# Altium footprint library phoenix.PcbLib: 55 footprints (part 1 of 4)
Each footprint in its own frame and in the unit in brackets; x right, y up, seen from the top. Pads: shape width x height; smd on the part's side, far side on the other; paste and mask are expansions set on the pad; w line width, h text height; cw(c..) or ccw(c..) is an arc to the next point about the centre after c.
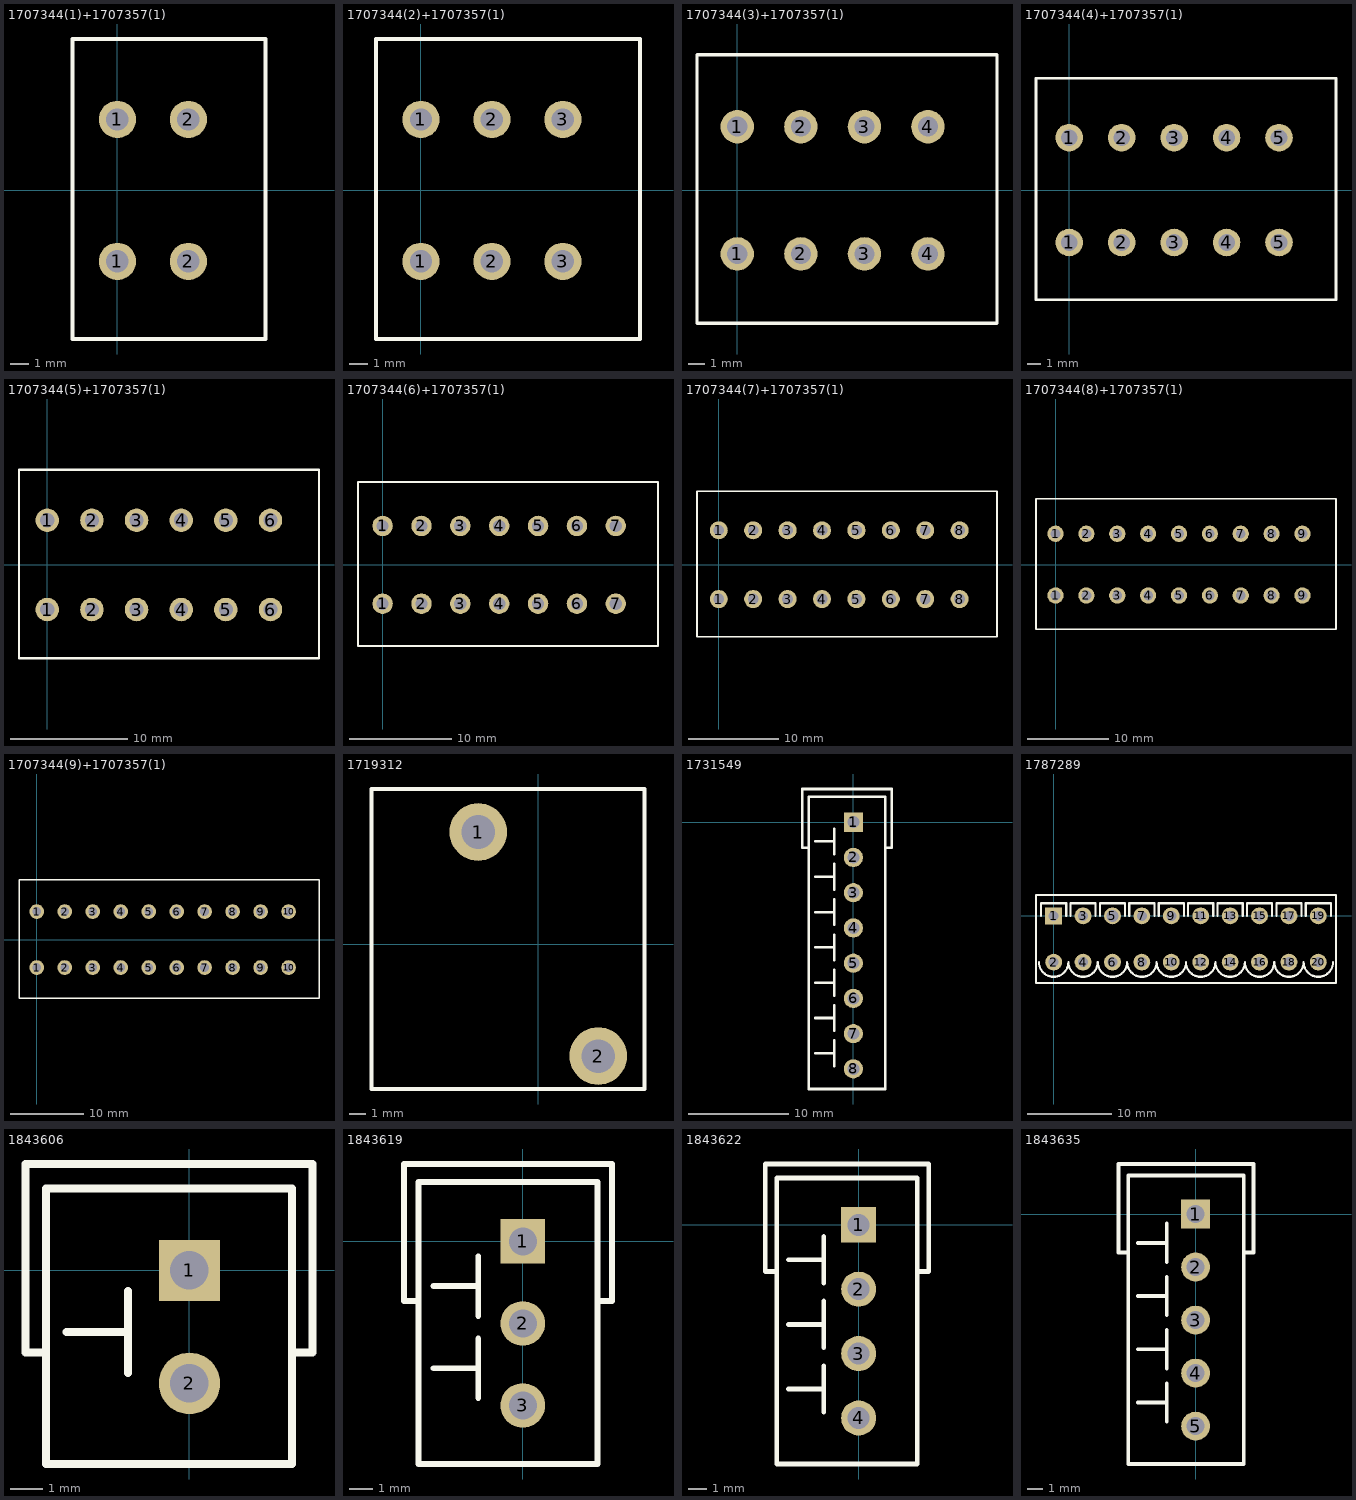
[diagram p0: the footprints below, top view; thin cyan lines are the x and y axes]

## 1707344(1)+1707357(1) [mm] "2 position 3.81mm spring terminals, vertical"
pads (4):
  round 2 hole 1.2: 1(0,-3.81) 1(0,3.81) 2(3.81,-3.81) 2(3.81,3.81)
Top Overlay:
  lines w0.203: -2.413,-7.976 -2.413,8.128 7.95,8.128 7.95,-7.976 -2.413,-7.976
3D body "1707344_01.stp": height 15.56, standoff -3.49, extent -2.311,-7.874 3.299,8.026
3D body "1707357_02.stp": height 15.56, standoff -3.49, extent 1.499,-7.874 7.849,8.026

## 1707344(2)+1707357(1) [mm] "3 position 3.81mm spring terminals, vertical"
pads (6):
  round 2 hole 1.2: 1(0,-3.81) 1(0,3.81) 2(3.81,-3.81) 2(3.81,3.81) 3(7.62,-3.81) 3(7.62,3.81)
Top Overlay:
  lines w0.203: -2.413,-7.976 -2.413,8.128 11.76,8.128 11.76,-7.976 -2.413,-7.976
3D body "1707344_01.stp": height 15.56, standoff -3.49, extent -2.311,-7.874 3.299,8.026
3D body "1707357_02.stp": height 15.56, standoff -3.49, extent 5.309,-7.874 11.659,8.026
3D body "1707344_01.stp": height 15.56, standoff -3.49, extent 1.499,-7.874 7.109,8.026

## 1707344(3)+1707357(1) [mm] "4 position 3.81mm spring terminals, vertical"
pads (8):
  round 2 hole 1.2: 1(0,-3.81) 1(0,3.81) 2(3.81,-3.81) 2(3.81,3.81) 3(7.62,-3.81) 3(7.62,3.81) 4(11.43,-3.81) 4(11.43,3.81)
Top Overlay:
  lines w0.203: -2.413,-7.976 -2.413,8.128 15.57,8.128 15.57,-7.976 -2.413,-7.976
3D body "1707344_01.stp": height 15.56, standoff -3.49, extent -2.311,-7.874 3.299,8.026
3D body "1707344_01.stp": height 15.56, standoff -3.49, extent 1.499,-7.874 7.109,8.026
3D body "1707357_02.stp": height 15.56, standoff -3.49, extent 9.119,-7.874 15.469,8.026
3D body "1707344_01.stp": height 15.56, standoff -3.49, extent 5.309,-7.874 10.919,8.026

## 1707344(4)+1707357(1) [mm] "5 position 3.81mm spring terminals, vertical"
pads (10):
  round 2 hole 1.2: 1(0,-3.81) 1(0,3.81) 2(3.81,-3.81) 2(3.81,3.81) 3(7.62,-3.81) 3(7.62,3.81) 4(11.43,-3.81) 4(11.43,3.81) 5(15.24,-3.81) 5(15.24,3.81)
Top Overlay:
  lines w0.203: -2.413,-7.976 19.38,-7.976 19.38,8.128 -2.413,8.128 -2.413,-7.976
3D body "1707344_01.stp": height 15.56, standoff -3.49, extent 5.309,-7.874 10.919,8.026
3D body "1707344_01.stp": height 15.56, standoff -3.49, extent 1.499,-7.874 7.109,8.026
3D body "1707344_01.stp": height 15.56, standoff -3.49, extent -2.311,-7.874 3.299,8.026
3D body "1707357_02.stp": height 15.56, standoff -3.49, extent 12.929,-7.874 19.279,8.026
3D body "1707344_01.stp": height 15.56, standoff -3.49, extent 9.119,-7.874 14.729,8.026

## 1707344(5)+1707357(1) [mm] "6 position 3.81mm spring terminals, vertical"
pads (12):
  round 2 hole 1.2: 1(0,-3.81) 1(0,3.81) 2(3.81,-3.81) 2(3.81,3.81) 3(7.62,-3.81) 3(7.62,3.81) 4(11.43,-3.81) 4(11.43,3.81) 5(15.24,-3.81) 5(15.24,3.81) 6(19.05,-3.81) 6(19.05,3.81)
Top Overlay:
  lines w0.203: -2.413,-7.976 -2.413,8.128 23.19,8.128 23.19,-7.976 -2.413,-7.976
3D body "1707344_01.stp": height 15.56, standoff -3.49, extent 12.929,-7.874 18.539,8.026
3D body "1707357_02.stp": height 15.56, standoff -3.49, extent 16.739,-7.874 23.089,8.026
3D body "1707344_01.stp": height 15.56, standoff -3.49, extent 9.119,-7.874 14.729,8.026
3D body "1707344_01.stp": height 15.56, standoff -3.49, extent -2.311,-7.874 3.299,8.026
3D body "1707344_01.stp": height 15.56, standoff -3.49, extent 1.499,-7.874 7.109,8.026
3D body "1707344_01.stp": height 15.56, standoff -3.49, extent 5.309,-7.874 10.919,8.026

## 1707344(6)+1707357(1) [mm] "7 position 3.81mm spring terminals, vertical"
pads (14):
  round 2 hole 1.2: 1(0,-3.81) 1(0,3.81) 2(3.81,-3.81) 2(3.81,3.81) 3(7.62,-3.81) 3(7.62,3.81) 4(11.43,-3.81) 4(11.43,3.81) 5(15.24,-3.81) 5(15.24,3.81) 6(19.05,-3.81) 6(19.05,3.81) 7(22.86,-3.81) 7(22.86,3.81)
Top Overlay:
  lines w0.203: -2.413,-7.976 -2.413,8.128 27,8.128 27,-7.976 -2.413,-7.976
3D body "1707344_01.stp": height 15.56, standoff -3.49, extent 16.739,-7.874 22.349,8.026
3D body "1707357_02.stp": height 15.56, standoff -3.49, extent 20.549,-7.874 26.899,8.026
3D body "1707344_01.stp": height 15.56, standoff -3.49, extent 12.929,-7.874 18.539,8.026
3D body "1707344_01.stp": height 15.56, standoff -3.49, extent 9.119,-7.874 14.729,8.026
3D body "1707344_01.stp": height 15.56, standoff -3.49, extent -2.311,-7.874 3.299,8.026
3D body "1707344_01.stp": height 15.56, standoff -3.49, extent 1.499,-7.874 7.109,8.026
3D body "1707344_01.stp": height 15.56, standoff -3.49, extent 5.309,-7.874 10.919,8.026

## 1707344(7)+1707357(1) [mm] "8 position 3.81mm spring terminals, vertical"
pads (16):
  round 2 hole 1.2: 1(0,-3.81) 1(0,3.81) 2(3.81,-3.81) 2(3.81,3.81) 3(7.62,-3.81) 3(7.62,3.81) 4(11.43,-3.81) 4(11.43,3.81) 5(15.24,-3.81) 5(15.24,3.81) 6(19.05,-3.81) 6(19.05,3.81) 7(22.86,-3.81) 7(22.86,3.81) 8(26.67,-3.81) 8(26.67,3.81)
Top Overlay:
  lines w0.203: -2.413,-7.976 -2.413,8.128 30.81,8.128 30.81,-7.976 -2.413,-7.976
3D body "1707344_01.stp": height 15.56, standoff -3.49, extent 16.739,-7.874 22.349,8.026
3D body "1707344_01.stp": height 15.56, standoff -3.49, extent 12.929,-7.874 18.539,8.026
3D body "1707344_01.stp": height 15.56, standoff -3.49, extent 9.119,-7.874 14.729,8.026
3D body "1707344_01.stp": height 15.56, standoff -3.49, extent -2.311,-7.874 3.299,8.026
3D body "1707344_01.stp": height 15.56, standoff -3.49, extent 1.499,-7.874 7.109,8.026
3D body "1707344_01.stp": height 15.56, standoff -3.49, extent 5.309,-7.874 10.919,8.026
3D body "1707357_02.stp": height 15.56, standoff -3.49, extent 24.359,-7.874 30.709,8.026
3D body "1707344_01.stp": height 15.56, standoff -3.49, extent 20.549,-7.874 26.159,8.026

## 1707344(8)+1707357(1) [mm] "9 position 3.81mm spring terminals, vertical"
pads (18):
  round 2 hole 1.2: 1(0,-3.81) 1(0,3.81) 2(3.81,-3.81) 2(3.81,3.81) 3(7.62,-3.81) 3(7.62,3.81) 4(11.43,-3.81) 4(11.43,3.81) 5(15.24,-3.81) 5(15.24,3.81) 6(19.05,-3.81) 6(19.05,3.81) 7(22.86,-3.81) 7(22.86,3.81) 8(26.67,-3.81) 8(26.67,3.81) 9(30.48,-3.81) 9(30.48,3.81)
Top Overlay:
  lines w0.203: -2.413,-7.976 -2.413,8.128 34.62,8.128 34.62,-7.976 -2.413,-7.976
3D body "1707344_01.stp": height 15.56, standoff -3.49, extent 24.359,-7.874 29.969,8.026
3D body "1707357_02.stp": height 15.56, standoff -3.49, extent 28.169,-7.874 34.519,8.026
3D body "1707344_01.stp": height 15.56, standoff -3.49, extent 16.739,-7.874 22.349,8.026
3D body "1707344_01.stp": height 15.56, standoff -3.49, extent 12.929,-7.874 18.539,8.026
3D body "1707344_01.stp": height 15.56, standoff -3.49, extent 9.119,-7.874 14.729,8.026
3D body "1707344_01.stp": height 15.56, standoff -3.49, extent -2.311,-7.874 3.299,8.026
3D body "1707344_01.stp": height 15.56, standoff -3.49, extent 1.499,-7.874 7.109,8.026
3D body "1707344_01.stp": height 15.56, standoff -3.49, extent 5.309,-7.874 10.919,8.026
3D body "1707344_01.stp": height 15.56, standoff -3.49, extent 20.549,-7.874 26.159,8.026

## 1707344(9)+1707357(1) [mm] "10 position 3.81mm spring terminals, vertical"
pads (20):
  round 2 hole 1.2: 1(0,-3.81) 1(0,3.81) 2(3.81,-3.81) 2(3.81,3.81) 3(7.62,-3.81) 3(7.62,3.81) 4(11.43,-3.81) 4(11.43,3.81) 5(15.24,-3.81) 5(15.24,3.81) 6(19.05,-3.81) 6(19.05,3.81) 7(22.86,-3.81) 7(22.86,3.81) 8(26.67,-3.81) 8(26.67,3.81) 9(30.48,-3.81) 9(30.48,3.81) 10(34.29,-3.81) 10(34.29,3.81)
Top Overlay:
  lines w0.203: -2.413,-7.976 38.43,-7.976 38.43,8.128 -2.413,8.128 -2.413,-7.976
3D body "1707344_01.stp": height 15.56, standoff -3.49, extent 28.169,-7.874 33.779,8.026
3D body "1707357_02.stp": height 15.56, standoff -3.49, extent 31.979,-7.874 38.329,8.026
3D body "1707344_01.stp": height 15.56, standoff -3.49, extent 20.549,-7.874 26.159,8.026
3D body "1707344_01.stp": height 15.56, standoff -3.49, extent 5.309,-7.874 10.919,8.026
3D body "1707344_01.stp": height 15.56, standoff -3.49, extent 1.499,-7.874 7.109,8.026
3D body "1707344_01.stp": height 15.56, standoff -3.49, extent -2.311,-7.874 3.299,8.026
3D body "1707344_01.stp": height 15.56, standoff -3.49, extent 9.119,-7.874 14.729,8.026
3D body "1707344_01.stp": height 15.56, standoff -3.49, extent 12.929,-7.874 18.539,8.026
3D body "1707344_01.stp": height 15.56, standoff -3.49, extent 16.739,-7.874 22.349,8.026
3D body "1707344_01.stp": height 15.56, standoff -3.49, extent 24.359,-7.874 29.969,8.026

## 1719312 [mm] "PCB terminal block - SPT 5/ 2-V-7,5-ZB - 1719312"
pads (2):
  round 3.6 hole 2.1: 1(-3.75,7) 2(3.75,-7)
Top Overlay:
  lines w0.254: -10.423,-9.057 -10.423,9.688 6.646,9.688 6.646,-9.057 -10.423,-9.057
3D body "1719312_03.stp": height 24.17, standoff -4.59, extent -10.291,-8.935 6.519,9.565

## 1731549 [mm] "8 Position Terminal Block Header, Male Pins, Shrouded (4 Side) 0.138\" (3.50mm) Vertical Through Hole"
pads (8):
  rect 1.905x1.905 hole 1.194: 1(0,0)
  round 1.905 hole 1.194: 2(0,-3.5) 3(0,-7) 4(0,-10.5) 5(0,-14) 6(0,-17.5) 7(0,-21) 8(0,-24.5)
Top Overlay:
  lines w0.254: -4.445,-2.54 -5.08,-2.54 -5.08,3.302 3.81,3.302 3.81,-2.54 3.302,-2.54 ; -3.81,-22.945 -1.905,-22.945 ; -3.81,-19.445 -1.905,-19.445 ; -3.81,-15.945 -1.905,-15.945 ; -3.81,-12.435 -1.905,-12.435 ; -3.81,-8.925 -1.905,-8.925 ; -3.81,-5.415 -1.905,-5.415 ; -3.81,-1.905 -1.905,-1.905 ; -1.905,-24.215 -1.905,-21.675 ; -1.905,-20.715 -1.905,-18.175 ; -1.905,-17.215 -1.905,-14.675 ; -1.905,-13.705 -1.905,-11.165 ; -1.905,-10.195 -1.905,-7.655 ; -1.905,-6.685 -1.905,-4.145 ; -1.905,-3.175 -1.905,-0.635 ; -4.445,-26.5 3.175,-26.5 3.175,2.54 -4.445,2.54 -4.445,-26.5

## 1787289 [mm] "TERM BLOCK HDR 20POS VERT 3.5MM"
pads (20):
  rect 2x2 hole 1.194: 1(0,0)
  round 2 hole 1.194: 2(0,-5.5) 3(3.5,0) 4(3.5,-5.5) 6(7,-5.5) 7(10.5,0) 8(10.5,-5.5) 9(14,0) 10(14,-5.5) 11(17.5,0) 12(17.5,-5.5) 13(21,0) 14(21,-5.5) 15(24.5,0) 16(24.5,-5.5) 17(28,0) 18(28,-5.5) 19(31.5,0) 20(31.5,-5.5)
  round 2 hole 1.4: 5(7,0)
Top Overlay:
  lines w0.254: -1.75,-5.5 ccw(c0,-5.5) 1.75,-5.5 ccw(c3.5,-5.5) 5.25,-5.5 ccw(c7,-5.5) 8.75,-5.5 ccw(c10.5,-5.5) 12.25,-5.5 ccw(c14,-5.5) 15.75,-5.5 ccw(c17.5,-5.5) 19.25,-5.5 ccw(c21,-5.5) 22.75,-5.5 ccw(c24.5,-5.5) 26.25,-5.5 ccw(c28,-5.5) 29.75,-5.5 ccw(c31.5,-5.5) 33.25,-5.5 ; -1.5,0 -1.5,1.5 1.5,1.5 1.5,0 ; 2,0 2,1.5 5,1.5 5,0 ; 5.5,0 5.5,1.5 8.5,1.5 8.5,0 ; 9,0 9,1.5 12,1.5 12,0 ; 12.5,0 12.5,1.5 15.5,1.5 15.5,0 ; 16,0 16,1.5 19,1.5 19,0 ; 19.5,0 19.5,1.5 22.5,1.5 22.5,0 ; 23,0 23,1.5 26,1.5 26,0 ; 26.5,0 26.5,1.5 29.5,1.5 29.5,0 ; 30,0 30,1.5 33,1.5 33,0 ; -2.1,-8 -2.1,2.5 33.6,2.5 33.6,-8 -2.1,-8
3D body "1787289_00.stp": height 10.01, standoff -2, extent -2.149,-8.069 33.655,2.531

## 1843606 [mil] "TERM BLOCK HDR 2POS VERT 3.5MM"
pads (2):
  rect 75x75 hole 47: 1(0,0)
  round 75 hole 47: 2(0,-137.8)
Top Overlay:
  lines w10: -175,-100 -200,-100 -200,130 150,130 150,-100 130,-100 ; -150,-75 -75,-75 ; -75,-125 -75,-25 ; -175,-236.22 125,-236.22 125,100 -175,100 -175,-236.22
3D body "1843606.stp": height 362.7, standoff -133.36, extent -167.32,-234.25 118.11,96.46

## 1843619 [mil] "3 Position Terminal Block Header, Male Pins, Shrouded (4 Side) 0.138\" (3.50mm) Vertical Through Hole"
pads (3):
  rect 75x75 hole 47: 1(0,0)
  round 75 hole 47: 2(0,-137.8) 3(0,-275.59)
Top Overlay:
  lines w10: -175,-100 -200,-100 -200,130 150,130 150,-100 130,-100 ; -150,-213.19 -75,-213.19 ; -150,-75 -75,-75 ; -75,-263.19 -75,-163.19 ; -75,-125 -75,-25 ; -175,-374.02 125,-374.02 125,100 -175,100 -175,-374.02
3D body "1843619.stp": height 362.7, standoff -133.36, extent -167.32,-372.05 118.11,96.46

## 1843622 [mil]
pads (4):
  rect 75x75 hole 47: 1(0,0)
  round 75 hole 47: 2(0,-137.8) 3(0,-275.59) 4(0,-413.39)
Top Overlay:
  lines w10: -175,-100 -200,-100 -200,130 150,130 150,-100 130,-100 ; -150,-351.38 -75,-351.38 ; -150,-213.19 -75,-213.19 ; -150,-75 -75,-75 ; -75,-401.38 -75,-301.38 ; -75,-263.19 -75,-163.19 ; -75,-125 -75,-25 ; -175,-511.81 125,-511.81 125,100 -175,100 -175,-511.81
3D body "1843622.stp": height 362.71, standoff -133.36, extent -167.72,-510 117.72,96.3

## 1843635 [mil]
pads (5):
  rect 75x75 hole 47: 1(0,0)
  round 75 hole 47: 2(0,-137.8) 3(0,-275.59) 4(0,-413.39) 5(0,-551.18)
Top Overlay:
  lines w10: -175,-100 -200,-100 -200,130 150,130 150,-100 130,-100 ; -150,-489.57 -75,-489.57 ; -150,-351.38 -75,-351.38 ; -150,-213.19 -75,-213.19 ; -150,-75 -75,-75 ; -75,-539.57 -75,-439.57 ; -75,-401.38 -75,-301.38 ; -75,-263.19 -75,-163.19 ; -75,-125 -75,-25 ; -175,-649.61 125,-649.61 125,100 -175,100 -175,-649.61
3D body "1843635.stp": height 362.71, standoff -133.36, extent -167.72,-647.1 117.72,97